# Altium footprint library Conectores GAM.PcbLib: 182 footprints (part 7 of 12)
Each footprint in its own frame and in the unit in brackets; x right, y up, seen from the top. Pads: shape width x height; smd on the part's side, far side on the other; paste and mask are expansions set on the pad; w line width, h text height; cw(c..) or ccw(c..) is an arc to the next point about the centre after c.
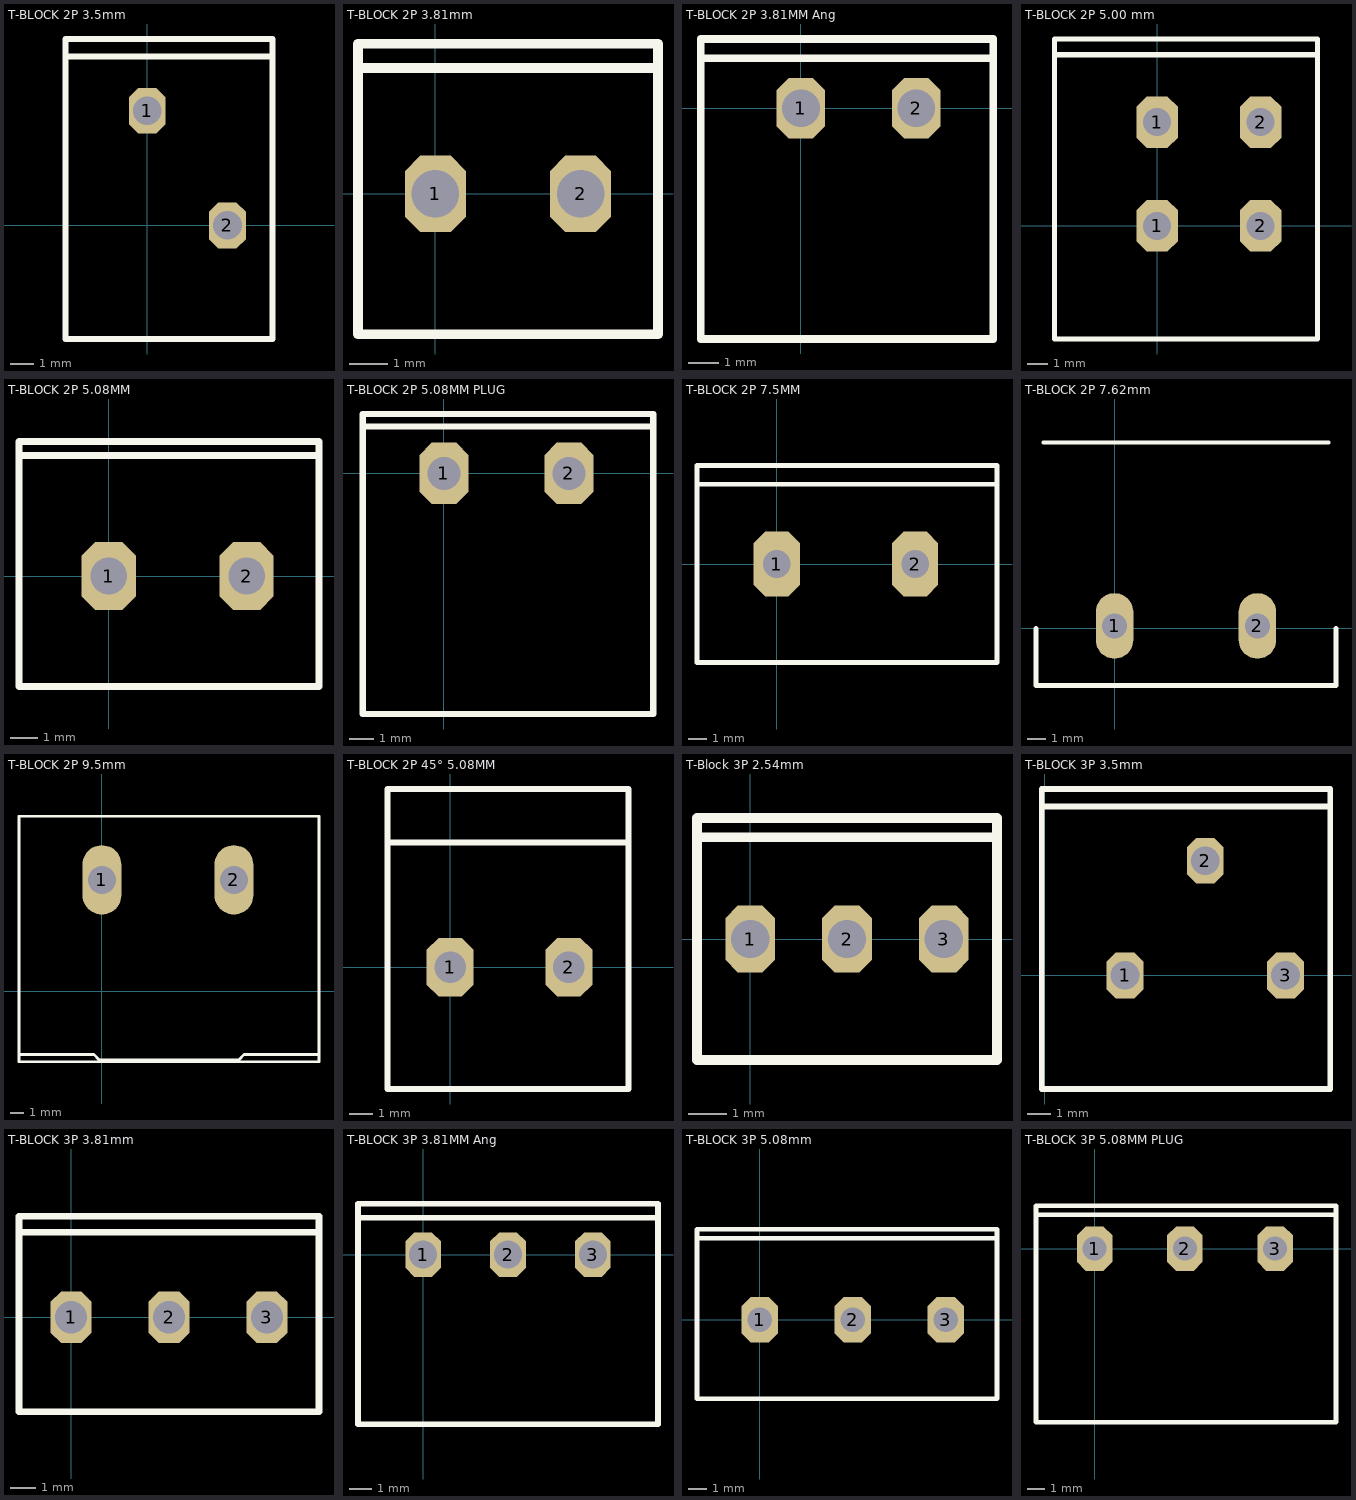
[diagram p6: the footprints below, top view; thin cyan lines are the x and y axes]

## T-BLOCK 2P 3.5mm [mm] "Terminal Block 2P 3.5mm"
pads (2):
  oct 1.6x2 hole 1.25: 1(0,5) 2(3.5,0)
Top Overlay:
  lines w0.254: -3.556,7.366 5.461,7.366 ; -3.556,-4.953 -3.556,8.128 5.461,8.128 5.461,-4.953 -3.556,-4.953
3D body "WURTH691412120002MB.stp": height 13.05, standoff -3.25, extent -3.321,-4.73 5.179,7.27

## T-BLOCK 2P 3.81mm [mm] "Terminal Block 2P 3.81mm"
pads (2):
  oct 1.6x2 hole 1.25: 1(0,0) 2(3.81,0)
Top Overlay:
  lines w0.254: -2.032,3.302 5.842,3.302 ; -2.032,-3.683 5.842,-3.683 5.842,3.937 -2.032,3.937 -2.032,-3.683
3D body "TB381X2.stp": height 8.5, standoff -3.5, extent -1.905,-3.617 5.715,3.683

## T-BLOCK 2P 3.81MM Ang [mm] "TERMINAL BLOCK 3.81MM 2P"
pads (2):
  oct 1.6x2 hole 1.25: 1(0,0) 2(3.81,0)
Top Overlay:
  lines w0.254: -3.302,1.651 6.35,1.651 ; -3.302,-7.62 6.35,-7.62 6.35,2.286 -3.302,2.286 -3.302,-7.62
3D body "TB 3.81 2pa.stp": height 7.8, standoff -3.3, extent -2.159,-17.586 5.461,-1.886
3D body "Ph-tb3812pm.stp": height 7.7, standoff -3.3, extent -3.091,-8.128 6.139,1.37

## T-BLOCK 2P 5.00 mm [mm] "Terminal de Bloque 2P 5mm TE 1-2834014-2"
pads (4):
  oct 2x2.5 hole 1.35: 1(0,0) 1(0,5) 2(5,0) 2(5,5)
Top Overlay:
  lines w0.254: -4.953,8.255 7.667,8.255 ; -4.953,-5.461 7.747,-5.461 7.747,9.017 -4.953,9.017 -4.953,-5.461
3D body "c-1-2834014-2-1-3d.stp": height 13.35, standoff -3.05, extent -4.603,-5.053 7.397,7.747

## T-BLOCK 2P 5.08MM [mm] "Terminal de Bloque 2P 5.08mm"
pads (2):
  oct 2x2.5 hole 1.35: 1(0,0) 2(5.08,0)
Top Overlay:
  lines w0.254: -3.175,4.445 7.747,4.445 ; -3.302,-4.064 -3.302,4.953 7.747,4.953 7.747,-4.064 -3.302,-4.064
3D body "tb1p.step": height 12.5, standoff -4.4, extent -3.14,-3.992 2.54,5.008
3D body "tb1p.step": height 12.5, standoff -4.4, extent 1.94,-3.992 7.62,5.008

## T-BLOCK 2P 5.08MM PLUG [mm] "Terminal de Bloque 2P 5.08mm 90"
pads (2):
  oct 2x2.5 hole 1.35: 1(0,0) 2(5.08,0)
Top Overlay:
  lines w0.254: -3.175,1.905 8.509,1.905 ; -3.302,-9.779 8.509,-9.779 8.509,2.413 -3.302,2.413 -3.302,-9.779
3D body "TB PlugIn 5.08mm 2PF.step": height 15.75, standoff -3.75, extent -3.26,-19.341 8.34,2.159

## T-BLOCK 2P 7.5MM [mm] "Terminal de Bloque 2P 7.5 mm"
pads (2):
  oct 2.5x3.5 hole 1.5: 1(0,0) 2(7.5,0)
Top Overlay:
  lines w0.254: -4.191,4.318 11.938,4.318 ; -4.318,-5.334 11.938,-5.334 11.938,5.334 -4.318,5.334 -4.318,-5.334
3D body "TB-2p 7.5mm.stp": height 11.8, standoff -3.3, extent -3.69,-3.944 11.31,3.556

## T-BLOCK 2P 7.62mm [mm] "Terminal de Bloque 7.62mm"
pads (2):
  oval 2x3.5 hole 1.35: 1(0,0.127) 2(7.62,0.127)
Top Overlay:
  lines w0.2: -3.81,9.906 11.43,9.906
  lines w0.254: -4.191,0 -4.191,-3.048 11.811,-3.048 11.811,0
3D body "TB2 7.61mm.step": height 13.5, standoff -5.25, extent -3.81,-2.721 11.43,9.779

## T-BLOCK 2P 9.5mm [mm] "Terminal de Bloque 9.5mm HB9500M-9.5-2P"
pads (2):
  oval 2.8x5 hole 2: 1(0,8) 2(9.5,8)
Top Overlay:
  lines w0.2: -5.969,-4.572 -0.572,-4.572 -0.191,-4.953 9.842,-4.953 10.223,-4.572 15.621,-4.572 ; -5.969,-5.08 15.621,-5.08 15.621,12.573 -5.969,12.573 -5.969,-5.08
3D body "HB9500M-9.5-2P.STEP": height 17.53, standoff -4.47, extent -5.461,-4.091 15.039,12.109

## T-BLOCK 2P 45° 5.08MM [mm] "Terminal de Bloque 2P 45° 5.08mm"
pads (2):
  oct 2x2.5 hole 1.35: 1(0,0) 2(5.08,0)
Top Overlay:
  lines w0.254: -2.667,5.334 7.62,5.334 ; -2.667,-5.207 7.62,-5.207 7.62,7.62 -2.667,7.62 -2.667,-5.207
3D body: height 0.25, standoff 0, extent 0.127,2.159 0.127,2.159
3D body "TB45-2P.stp": height 12.25, standoff -4.18, extent -2.54,-4.976 7.46,7.516

## T-Block 3P 2.54mm [mm] "Terminal de Bloque 3P 2.54mm"
pads (3):
  oct 1.3x1.75 hole 1: 1(0,0) 2(2.54,0) 3(5.08,0)
Top Overlay:
  lines w0.254: -1.397,2.667 6.477,2.667 ; -1.397,-3.175 6.477,-3.175 6.477,3.175 -1.397,3.175 -1.397,-3.175
3D body "TBLOCK 30 2.54.STEP": height 10.2, standoff -3.2, extent -1.5,-3.25 6.58,3.25

## T-BLOCK 3P 3.5mm [mm] "Terminal Block 3P 3.5mm"
pads (3):
  oct 1.6x2 hole 1.25: 1(3.5,0) 2(7,5) 3(10.5,0)
Top Overlay:
  lines w0.254: -0.127,7.366 12.446,7.366 ; -0.127,-4.953 -0.127,8.128 12.446,8.128 12.446,-4.953 -0.127,-4.953
3D body "TB3.5MM-W691412120003B (rev1).stp": height 13.05, standoff -3.25, extent 0.179,-4.73 12.179,7.27

## T-BLOCK 3P 3.81mm [mm] "Terminal de Bloque 3P 3.81mm"
pads (3):
  oct 1.6x2 hole 1.25: 1(0,0) 2(3.81,0) 3(7.62,0)
Top Overlay:
  lines w0.254: -2.032,3.302 9.652,3.302 ; -2.032,-3.683 9.652,-3.683 9.652,3.937 -2.032,3.937 -2.032,-3.683
3D body "KF350-3P.STEP": height 8.8, standoff -2.6, extent -1.44,-3.302 9.06,3.598

## T-BLOCK 3P 3.81MM Ang [mm] "TERMINAL BLOCK 3.81MM 3P"
pads (3):
  oct 1.6x2 hole 1.25: 1(0,0) 2(3.81,0) 3(7.62,0)
Top Overlay:
  lines w0.254: -2.794,1.651 10.414,1.651 ; -2.921,-7.62 10.541,-7.62 10.541,2.286 -2.921,2.286 -2.921,-7.62
3D body "TB 3.81 3Pa.stp": height 7.8, standoff -3.3, extent -2.286,-17.883 9.144,-2.183
3D body "ph-tb3-381.stp": height 7.25, standoff -3.4, extent -2.6,-7.903 10.22,1.397

## T-BLOCK 3P 5.08mm [mm] "Terminal Block 3P 5.08mm"
pads (3):
  oct 2x2.5 hole 1.35: 1(0,0) 2(5.08,0) 3(10.16,0)
Top Overlay:
  lines w0.254: -3.302,4.445 12.954,4.445 ; -3.429,-4.318 -3.429,4.953 12.954,4.953 12.954,-4.318 -3.429,-4.318
3D body "tb1p.step": height 12.5, standoff -4.4, extent -3.14,-4.119 2.54,4.881
3D body "tb1p.step": height 12.5, standoff -4.4, extent 1.94,-4.119 7.62,4.881
3D body "tb1p.step": height 12.5, standoff -4.4, extent 7.02,-4.119 12.7,4.881

## T-BLOCK 3P 5.08MM PLUG [mm] "Terminal de Bloque 3P 5.08mm 90"
pads (3):
  oct 2x2.5 hole 1.35: 1(0,0) 2(5.08,0) 3(10.16,0)
Top Overlay:
  lines w0.254: -3.175,1.905 13.589,1.905 ; -3.302,-9.779 13.589,-9.779 13.589,2.413 -3.302,2.413 -3.302,-9.779
3D body "TB PlugIn 5.08mm 2PF.step": height 15.75, standoff -3.75, extent -3.26,-19.341 8.34,2.159
3D body: height 0.25, standoff 0, extent 0.127,2.159 0.127,2.159
3D body "TB PlugIn 5.08mm 2PF.step": height 15.75, standoff -3.75, extent 1.82,-19.341 13.42,2.159